# Altium footprint library 6.Transistors&Chips.PcbLib: 88 footprints (part 1 of 6)
Each footprint in its own frame and in the unit in brackets; x right, y up, seen from the top. Pads: shape width x height; smd on the part's side, far side on the other; paste and mask are expansions set on the pad; w line width, h text height; cw(c..) or ccw(c..) is an arc to the next point about the centre after c.
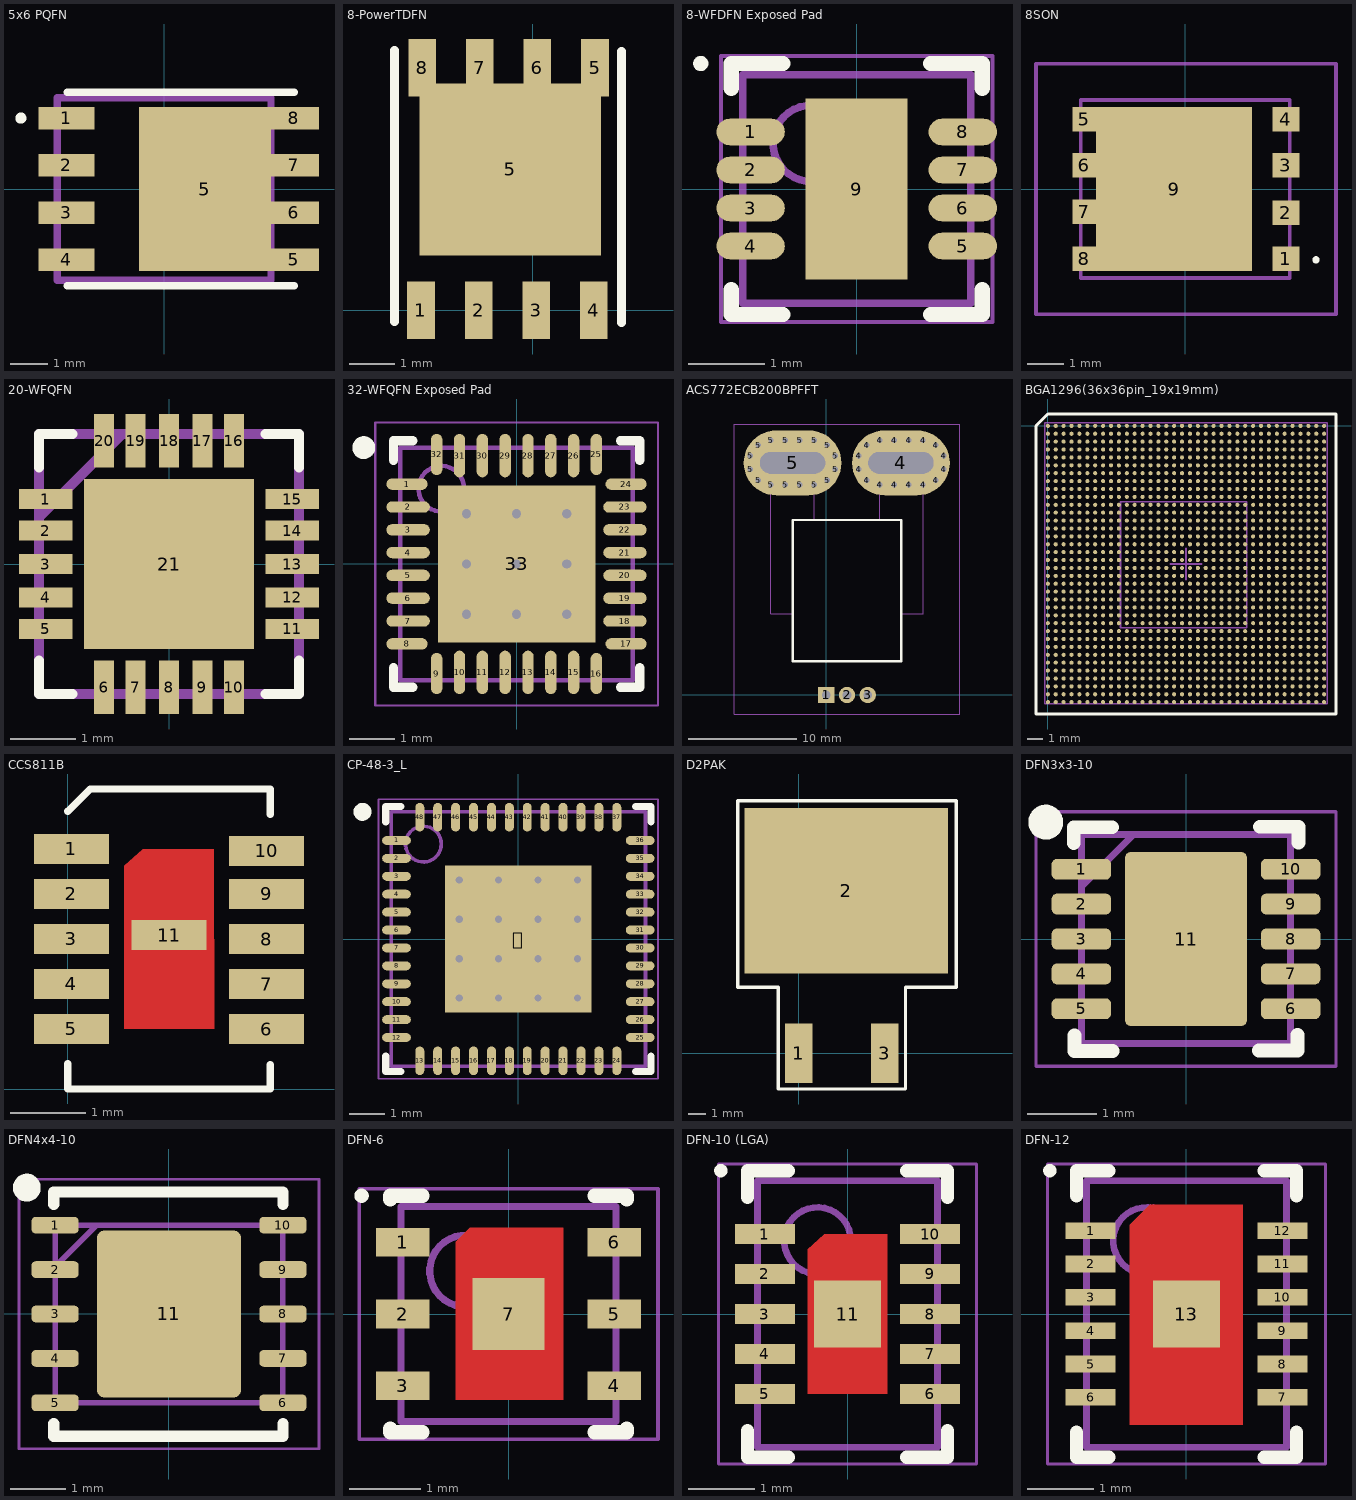
[diagram p0: the footprints below, top view; thin cyan lines are the x and y axes]

## 5x6 PQFN [mm] "IRFH8318"
pads (9):
  rect 1.5x0.6 smd: 1(-2.625,1.905) 2(-2.625,0.635) 3(-2.625,-0.635) 4(-2.625,-1.905)
  rect 3.545x4.41 smd: 5(1.1,0)
  rect 1.35x0.6 smd: 5(3.49,-1.905) 6(3.49,-0.635) 7(3.49,0.635) 8(3.49,1.905)
Top Overlay:
  lines w0.2: -2.6,-2.6 3.5,-2.6 ; -2.6,2.6 3.5,2.6 ; -3.9,1.905 cw(c-3.85,1.905) -3.8,1.905 ; -3.9,1.905 ccw(c-3.85,1.905) -3.8,1.905 ; -3.9,1.905 cw(c-3.85,1.905) -3.8,1.905
Mechanical 13:
  lines w0.2: -2.875,-2.45 2.875,-2.45 2.875,2.45 -2.875,2.45 -2.875,-2.45
3D body "User Library-PQFN8_5X6.STEP": height 1, standoff 0, extent -2.7,-2.55 3.5,2.55

## 8-PowerTDFN [mm]
pads (9):
  rect 0.61x1.27 smd: 1(-2.465,0) 2(-1.195,0) 3(0.075,0) 4(1.345,0) 5(1.37,5.34) 6(0.1,5.34) 7(-1.17,5.34) 8(-2.44,5.34)
  rect 4x3.8 smd: 5(-0.5,3.1)
Top Overlay:
  lines w0.2: -3.05,-0.25 -3.05,5.725 ; 1.95,-0.275 1.95,5.7
3D body "User Library-DQH0008A.STEP": height 1.05, standoff 0, extent -3.05,-0.275 1.95,5.725

## 8-WFDFN Exposed Pad [mm] "PSON, 8-Leads, Body 3.00x3.00mm, Pitch 0.50mm, Thermal Pad 2.38x1.34mm, IPC Medium Density"
height 0.75
pads (9):
  rrect100% 0.9x0.35 smd: 1(-1.395,0.75) 2(-1.395,0.25) 3(-1.395,-0.25) 4(-1.395,-0.75) 5(1.395,-0.75) 6(1.395,-0.25) 7(1.395,0.25) 8(1.395,0.75)
  rect 1.34x2.38 smd: 9(0,0)
Top Overlay:
  circle w0.1: c-2.05,1.65 r0.05
  lines w0.2: -1.65,-1.325 -1.65,-1.65 -0.97,-1.65 ; -1.65,1.325 -1.65,1.65 -0.97,1.65 ; 0.97,-1.65 1.65,-1.65 1.65,-1.325 ; 0.97,1.65 1.65,1.65 1.65,1.325
Mechanical 13:
  circle w0.1: c-0.6,0.6 r0.5
  lines w0.1: -1.5,-1.5 1.5,-1.5 1.5,1.5 -1.5,1.5 -1.5,-1.5
Mechanical 15:
  lines w0.05: -1.785,-1.75 1.785,-1.75 1.785,1.75 -1.785,1.75 -1.785,-1.75
  lines w0.1: -0.5,0 0.5,0 ; 0,-0.5 0,0.5
3D body "PSON50P300X75_HS-9N.step": height 0.75, standoff 0, extent -1.501,-1.5 1.501,1.5

## 8SON [mm]
pads (9):
  rect 0.75x0.675 smd: 1(2.776,-1.918) 2(2.776,-0.66) 3(2.776,0.66) 4(2.776,1.918)
  rect 0.655x0.675 smd: 5(-2.776,1.918) 6(-2.776,0.66) 7(-2.776,-0.622) 8(-2.776,-1.918)
  rect 4.295x4.51 smd: 9(-0.301,0)
Top Overlay:
  lines w0.1: 3.6,-2 cw(c3.6,-1.95) 3.6,-1.9 cw(c3.6,-1.95) 3.6,-2
Mechanical 13:
  lines w0.1: -2.875,-2.45 -2.875,2.45 2.875,2.45 2.875,-2.45 -2.875,-2.45
Mechanical 15:
  lines w0.1: -4.104,-3.45 -4.104,3.45 4.152,3.45 4.152,-3.45 -4.104,-3.45
3D body "CSD16403Q5A.stp": height 1.15, standoff 0, extent -3.13,-2.45 3.13,2.45

## 20-WFQFN [mil]
pads (21):
  rect 32x12 smd: 1(-74,39) 2(-74,20) 3(-74,0) 4(-74,-20) 5(-74,-39) 11(74,-39) 12(74,-20) 13(74,0) 14(74,20) 15(74,39)
  rect 12x32 smd: 6(-39,-74) 7(-20,-74) 8(0,-74) 9(20,-74) 10(39,-74) 16(39,74) 17(20,74) 18(0,74) 19(-20,74) 20(-39,74)
  rect 102x102 smd: 21(0,0)
Top Overlay:
  lines w6: -78,-58 -78,-78 -58,-78 ; -78,58 -78,78 -58,78 ; 58,-78 78,-78 78,-58 ; 58,78 78,78 78,58
Mechanical 13:
  lines w6: -78,-45 -78,-33 ; -78,-26 -78,-14 ; -78,-6 -78,6 ; -78,14 -78,26 ; -78,28 -28,78 ; -78,33 -78,45 ; -45,-78 -33,-78 ; -45,78 -33,78 ; -26,-78 -14,-78 ; -26,78 -14,78 ; -6,-78 6,-78 ; -6,78 6,78 ; 14,-78 26,-78 ; 14,78 26,78 ; 33,-78 45,-78 ; 33,78 45,78 ; 78,-45 78,-33 ; 78,-26 78,-14 ; 78,-6 78,6 ; 78,14 78,26 ; 78,33 78,45 ; -78,-78 78,-78 78,78 -78,78 -78,-78
3D body "LT3741IUFPBF.stp": height 29.53, standoff 0, extent -78.74,-78.74 78.74,78.74

## 32-WFQFN Exposed Pad [mm] "QFN, 32-Leads, Body 5.00x5.00mm, Pitch 0.50mm, Thermal Pad 3.45x3.45mm, IPC Medium Density"
height 0.8
pads (33):
  oval 0.9x0.25 smd: 1(-2.4,1.75) 8(-2.4,-1.75) 17(2.4,-1.75) 24(2.4,1.75)
  oval 0.95x0.25 smd: 2(-2.375,1.25) 3(-2.375,0.75) 4(-2.375,0.25) 5(-2.375,-0.25) 6(-2.375,-0.75) 7(-2.375,-1.25) 18(2.375,-1.25) 19(2.375,-0.75) 20(2.375,-0.25) 21(2.375,0.25) 22(2.375,0.75) 23(2.375,1.25)
  oval 0.25x0.9 smd: 9(-1.75,-2.4) 16(1.75,-2.4) 25(1.75,2.4) 32(-1.75,2.4)
  oval 0.25x0.95 smd: 10(-1.25,-2.375) 11(-0.75,-2.375) 12(-0.25,-2.375) 13(0.25,-2.375) 14(0.75,-2.375) 15(1.25,-2.375) 26(1.25,2.375) 27(0.75,2.375) 28(0.25,2.375) 29(-0.25,2.375) 30(-0.75,2.375) 31(-1.25,2.375)
  rect 3.45x3.45 smd: 33(0,0)
via -1.1,1.1 diameter 0.5 hole 0.2
via 0,1.1 diameter 0.5 hole 0.2
via 1.1,1.1 diameter 0.5 hole 0.2
via -1.1,0 diameter 0.5 hole 0.2
via 0,0 diameter 0.5 hole 0.2
via 1.1,0 diameter 0.5 hole 0.2
via -1.1,-1.1 diameter 0.5 hole 0.2
via 0,-1.1 diameter 0.5 hole 0.2
via 1.1,-1.1 diameter 0.5 hole 0.2
Top Overlay:
  circle w0.25: c-3.35,2.55 r0.125
  lines w0.2: -2.7,-2.275 -2.7,-2.7 -2.275,-2.7 ; -2.7,2.275 -2.7,2.7 -2.275,2.7 ; 2.275,-2.7 2.7,-2.7 2.7,-2.275 ; 2.275,2.7 2.7,2.7 2.7,2.275
Mechanical 13:
  circle w0.1: c-1.65,1.65 r0.5
  lines w0.1: -2.55,-2.55 -2.55,2.55 2.55,2.55 2.55,-2.55 -2.55,-2.55
Mechanical 15:
  lines w0.05: -3.1,-3.1 -3.1,3.1 3.1,3.1 3.1,-3.1 -3.1,-3.1
  lines w0.1: -0.5,0 0.5,0 ; 0,-0.5 0,0.5
3D body "QFN50P500X500X80_HS-33N.step": height 0.8, standoff 0, extent -2.6,-2.6 2.6,2.6

## ACS772ECB200BPFFT [mm]
pads (37):
  rect 1.5x1.5 hole 0.8: 1(0,0)
  round 1.5 hole 0.8: 2(1.91,0) 3(3.82,0)
  round 1 hole 0.5: 4(3.008,20.782) 4(3.008,22.018) 4(3.734,19.782) 4(3.734,23.018) 4(4.91,19.35) 4(4.91,23.45) 4(6.243,19.35) 4(6.243,23.45) 4(7.577,19.35) 4(7.577,23.45) 4(8.91,19.35) 4(8.91,23.45) 4(10.086,19.782) 4(10.086,23.018) 4(10.812,20.782) 4(10.812,22.018) 5(-6.992,20.782) 5(-6.992,22.018) 5(-6.266,19.782) 5(-6.266,23.018) 5(-5.09,19.35) 5(-5.09,23.45) 5(-3.757,19.35) 5(-3.757,23.45) 5(-2.423,19.35) 5(-2.423,23.45) 5(-1.09,19.35) 5(-1.09,23.45) 5(0.086,19.782) 5(0.086,23.018) 5(0.812,20.782) 5(0.812,22.018)
  rrect100% 9x6 hole 2 slot 6 at 0 deg: 4(6.875,21.375) 5(-3.1,21.375)
Top Overlay:
  lines w0.2: -5.39,21 -4.49,21 -4.49,21.4 -5.29,21.4 -5.29,21.8 -4.39,21.8 ; -4.09,21.9 -4.09,21 -3.29,21 ; -2.99,21.8 -2.09,21.8 -2.09,21 -2.89,21 -2.89,21.8 ; -1.69,21.8 -0.89,21.8 ; -1.29,20.9 -1.29,21.8 ; 4.61,21 5.51,21 5.51,21.4 4.71,21.4 4.71,21.8 5.61,21.8 ; 5.91,21.9 5.91,21 6.71,21 ; 7.11,21.8 7.91,21.8 7.91,21 7.11,21 7.11,21.9 ; 8.31,21.8 9.11,21.8 ; 8.71,20.9 8.71,21.9 ; -3.09,3.1 6.91,3.1 6.91,16.1 -3.09,16.1 -3.09,3.1
Mechanical 13:
  lines w0.1: -3.09,7.5 -5.09,7.5 -5.09,20.3 -1.09,20.3 -1.09,16.1 ; 4.91,16.1 4.91,20.3 8.91,20.3 8.91,7.5 6.91,7.5 ; -5.09,20.4 cw(c-5.09,21.4) -5.09,22.4 -1.09,22.4 cw(c-1.09,21.4) -1.09,20.4 -5.09,20.4 ; -3.09,3.1 6.91,3.1 6.91,16.1 -3.09,16.1 -3.09,3.1 ; 4.91,20.4 cw(c4.91,21.4) 4.91,22.4 8.91,22.4 cw(c8.91,21.4) 8.91,20.4 4.91,20.4
Mechanical 15:
  lines w0.1: -8.492,-1.75 12.312,-1.75 12.312,24.95 -8.492,24.95 -8.492,-1.75
3D body "ACS758LCB-050U-PFF-T.stp": height 6.97, standoff -3.57, extent -5.062,-0.484 8.938,22.333

## BGA1296(36x36pin_19x19mm) [mm]
height 2.5
pads (1296):
  round 0.26 smd mask+0.06: A1(0,0) A2(0.5,0) A3(1,0) A4(1.5,0) A5(2,0) A6(2.5,0) A7(3,0) A8(3.5,0) A9(4,0) A10(4.5,0) A11(5,0) A12(5.5,0) A13(6,0) A14(6.5,0) A15(7,0) A16(7.5,0) A17(8,0) A18(8.5,0) A19(9,0) A20(9.5,0) A21(10,0) A22(10.5,0) A23(11,0) A24(11.5,0) A25(12,0) A26(12.5,0) A27(13,0) A28(13.5,0) A29(14,0) A30(14.5,0) A31(15,0) A32(15.5,0) A33(16,0) A34(16.5,0) A35(17,0) A36(17.5,0) AA1(0,-10) AA2(0.5,-10) AA3(1,-10) AA4(1.5,-10) AA5(2,-10) AA6(2.5,-10) AA7(3,-10) AA8(3.5,-10) AA9(4,-10) AA10(4.5,-10) AA11(5,-10) AA12(5.5,-10) AA13(6,-10) AA14(6.5,-10) AA15(7,-10) AA16(7.5,-10) AA17(8,-10) AA18(8.5,-10) AA19(9,-10) AA20(9.5,-10) AA21(10,-10) AA22(10.5,-10) AA23(11,-10) AA24(11.5,-10) AA25(12,-10) AA26(12.5,-10) AA27(13,-10) AA28(13.5,-10) AA29(14,-10) AA30(14.5,-10) AA31(15,-10) AA32(15.5,-10) AA33(16,-10) AA34(16.5,-10) AA35(17,-10) AA36(17.5,-10) AB1(0,-10.5) AB2(0.5,-10.5) AB3(1,-10.5) AB4(1.5,-10.5) AB5(2,-10.5) AB6(2.5,-10.5) AB7(3,-10.5) AB8(3.5,-10.5) AB9(4,-10.5) AB10(4.5,-10.5) AB11(5,-10.5) AB12(5.5,-10.5) AB13(6,-10.5) AB14(6.5,-10.5) AB15(7,-10.5) AB16(7.5,-10.5) AB17(8,-10.5) AB18(8.5,-10.5) AB19(9,-10.5) AB20(9.5,-10.5) AB21(10,-10.5) AB22(10.5,-10.5) AB23(11,-10.5) AB24(11.5,-10.5) AB25(12,-10.5) AB26(12.5,-10.5) AB27(13,-10.5) AB28(13.5,-10.5) AB29(14,-10.5) AB30(14.5,-10.5) AB31(15,-10.5) AB32(15.5,-10.5) AB33(16,-10.5) AB34(16.5,-10.5) AB35(17,-10.5) AB36(17.5,-10.5) AC1(0,-11) AC2(0.5,-11) AC3(1,-11) AC4(1.5,-11) AC5(2,-11) AC6(2.5,-11) AC7(3,-11) AC8(3.5,-11) AC9(4,-11) AC10(4.5,-11) AC11(5,-11) AC12(5.5,-11) AC13(6,-11) AC14(6.5,-11) AC15(7,-11) AC16(7.5,-11) AC17(8,-11) AC18(8.5,-11) AC19(9,-11) AC20(9.5,-11) AC21(10,-11) AC22(10.5,-11) AC23(11,-11) AC24(11.5,-11) AC25(12,-11) AC26(12.5,-11) AC27(13,-11) AC28(13.5,-11) AC29(14,-11) AC30(14.5,-11) AC31(15,-11) AC32(15.5,-11) AC33(16,-11) AC34(16.5,-11) AC35(17,-11) AC36(17.5,-11) AD1(0,-11.5) AD2(0.5,-11.5) AD3(1,-11.5) AD4(1.5,-11.5) AD5(2,-11.5) AD6(2.5,-11.5) AD7(3,-11.5) AD8(3.5,-11.5) AD9(4,-11.5) AD10(4.5,-11.5) AD11(5,-11.5) AD12(5.5,-11.5) AD13(6,-11.5) AD14(6.5,-11.5) AD15(7,-11.5) AD16(7.5,-11.5) AD17(8,-11.5) AD18(8.5,-11.5) AD19(9,-11.5) AD20(9.5,-11.5) AD21(10,-11.5) AD22(10.5,-11.5) AD23(11,-11.5) AD24(11.5,-11.5) AD25(12,-11.5) AD26(12.5,-11.5) AD27(13,-11.5) AD28(13.5,-11.5) AD29(14,-11.5) AD30(14.5,-11.5) AD31(15,-11.5) AD32(15.5,-11.5) AD33(16,-11.5) AD34(16.5,-11.5) AD35(17,-11.5) AD36(17.5,-11.5) AE1(0,-12) AE2(0.5,-12) AE3(1,-12) AE4(1.5,-12) AE5(2,-12) AE6(2.5,-12) AE7(3,-12) AE8(3.5,-12) AE9(4,-12) AE10(4.5,-12) AE11(5,-12) AE12(5.5,-12) AE13(6,-12) AE14(6.5,-12) AE15(7,-12) AE16(7.5,-12) AE17(8,-12) AE18(8.5,-12) AE19(9,-12) AE20(9.5,-12) AE21(10,-12) AE22(10.5,-12) AE23(11,-12) AE24(11.5,-12) AE25(12,-12) AE26(12.5,-12) AE27(13,-12) AE28(13.5,-12) AE29(14,-12) AE30(14.5,-12) AE31(15,-12) AE32(15.5,-12) AE33(16,-12) AE34(16.5,-12) AE35(17,-12) AE36(17.5,-12) AF1(0,-12.5) AF2(0.5,-12.5) AF3(1,-12.5) AF4(1.5,-12.5) AF5(2,-12.5) AF6(2.5,-12.5) AF7(3,-12.5) AF8(3.5,-12.5) AF9(4,-12.5) AF10(4.5,-12.5) AF11(5,-12.5) AF12(5.5,-12.5) AF13(6,-12.5) AF14(6.5,-12.5) AF15(7,-12.5) AF16(7.5,-12.5) AF17(8,-12.5) AF18(8.5,-12.5) AF19(9,-12.5) AF20(9.5,-12.5) AF21(10,-12.5) AF22(10.5,-12.5) AF23(11,-12.5) AF24(11.5,-12.5) AF25(12,-12.5) AF26(12.5,-12.5) AF27(13,-12.5) AF28(13.5,-12.5) AF29(14,-12.5) AF30(14.5,-12.5) AF31(15,-12.5) AF32(15.5,-12.5) AF33(16,-12.5) AF34(16.5,-12.5) AF35(17,-12.5) AF36(17.5,-12.5) AG1(0,-13) AG2(0.5,-13) AG3(1,-13) AG4(1.5,-13) AG5(2,-13) AG6(2.5,-13) AG7(3,-13) AG8(3.5,-13) AG9(4,-13) AG10(4.5,-13) AG11(5,-13) AG12(5.5,-13) AG13(6,-13) AG14(6.5,-13) AG15(7,-13) AG16(7.5,-13) AG17(8,-13) AG18(8.5,-13) AG19(9,-13) AG20(9.5,-13) AG21(10,-13) AG22(10.5,-13) AG23(11,-13) AG24(11.5,-13) AG25(12,-13) AG26(12.5,-13) AG27(13,-13) AG28(13.5,-13) AG29(14,-13) AG30(14.5,-13) AG31(15,-13) AG32(15.5,-13) AG33(16,-13) AG34(16.5,-13) AG35(17,-13) AG36(17.5,-13) AH1(0,-13.5) AH2(0.5,-13.5) AH3(1,-13.5) AH4(1.5,-13.5) AH5(2,-13.5) AH6(2.5,-13.5) AH7(3,-13.5) AH8(3.5,-13.5) AH9(4,-13.5) AH10(4.5,-13.5) AH11(5,-13.5) AH12(5.5,-13.5) AH13(6,-13.5) AH14(6.5,-13.5) AH15(7,-13.5) AH16(7.5,-13.5) AH17(8,-13.5) AH18(8.5,-13.5) AH19(9,-13.5) AH20(9.5,-13.5) AH21(10,-13.5) AH22(10.5,-13.5) AH23(11,-13.5) AH24(11.5,-13.5) AH25(12,-13.5) AH26(12.5,-13.5) AH27(13,-13.5) AH28(13.5,-13.5) AH29(14,-13.5) AH30(14.5,-13.5) AH31(15,-13.5) AH32(15.5,-13.5) AH33(16,-13.5) AH34(16.5,-13.5) AH35(17,-13.5) AH36(17.5,-13.5) AJ1(0,-14) AJ2(0.5,-14) AJ3(1,-14) AJ4(1.5,-14) AJ5(2,-14) AJ6(2.5,-14) AJ7(3,-14) AJ8(3.5,-14) AJ9(4,-14) AJ10(4.5,-14) AJ11(5,-14) AJ12(5.5,-14) AJ13(6,-14) AJ14(6.5,-14) AJ15(7,-14) AJ16(7.5,-14) AJ17(8,-14) AJ18(8.5,-14) AJ19(9,-14) AJ20(9.5,-14) AJ21(10,-14) AJ22(10.5,-14) AJ23(11,-14) AJ24(11.5,-14) AJ25(12,-14) AJ26(12.5,-14) AJ27(13,-14) AJ28(13.5,-14) AJ29(14,-14) AJ30(14.5,-14) AJ31(15,-14) AJ32(15.5,-14) AJ33(16,-14) AJ34(16.5,-14) AJ35(17,-14) AJ36(17.5,-14) AK1(0,-14.5) AK2(0.5,-14.5) AK3(1,-14.5) AK4(1.5,-14.5) AK5(2,-14.5) AK6(2.5,-14.5) AK7(3,-14.5) AK8(3.5,-14.5) AK9(4,-14.5) AK10(4.5,-14.5) AK11(5,-14.5) AK12(5.5,-14.5) AK13(6,-14.5) AK14(6.5,-14.5) AK15(7,-14.5) AK16(7.5,-14.5) AK17(8,-14.5) AK18(8.5,-14.5) AK19(9,-14.5) AK20(9.5,-14.5) AK21(10,-14.5) AK22(10.5,-14.5) AK23(11,-14.5) AK24(11.5,-14.5) AK25(12,-14.5) AK26(12.5,-14.5) AK27(13,-14.5) AK28(13.5,-14.5) AK29(14,-14.5) AK30(14.5,-14.5) AK31(15,-14.5) AK32(15.5,-14.5) AK33(16,-14.5) AK34(16.5,-14.5) AK35(17,-14.5) AK36(17.5,-14.5) AL1(0,-15) AL2(0.5,-15) AL3(1,-15) AL4(1.5,-15) AL5(2,-15) AL6(2.5,-15) AL7(3,-15) AL8(3.5,-15) AL9(4,-15) AL10(4.5,-15) AL11(5,-15) AL12(5.5,-15) AL13(6,-15) AL14(6.5,-15) AL15(7,-15) AL16(7.5,-15) AL17(8,-15) AL18(8.5,-15) AL19(9,-15) AL20(9.5,-15) AL21(10,-15) AL22(10.5,-15) AL23(11,-15) AL24(11.5,-15) AL25(12,-15) AL26(12.5,-15) AL27(13,-15) AL28(13.5,-15) AL29(14,-15) AL30(14.5,-15) AL31(15,-15) AL32(15.5,-15) AL33(16,-15) AL34(16.5,-15) AL35(17,-15) AL36(17.5,-15) AM1(0,-15.5) AM2(0.5,-15.5) AM3(1,-15.5) AM4(1.5,-15.5) AM5(2,-15.5) AM6(2.5,-15.5) AM7(3,-15.5) AM8(3.5,-15.5) AM9(4,-15.5) AM10(4.5,-15.5) AM11(5,-15.5) AM12(5.5,-15.5) AM13(6,-15.5) AM14(6.5,-15.5) AM15(7,-15.5) AM16(7.5,-15.5) AM17(8,-15.5) AM18(8.5,-15.5) AM19(9,-15.5) AM20(9.5,-15.5) AM21(10,-15.5) AM22(10.5,-15.5) AM23(11,-15.5) AM24(11.5,-15.5) AM25(12,-15.5) AM26(12.5,-15.5) AM27(13,-15.5) AM28(13.5,-15.5) AM29(14,-15.5) AM30(14.5,-15.5) AM31(15,-15.5) AM32(15.5,-15.5) AM33(16,-15.5) AM34(16.5,-15.5) AM35(17,-15.5) AM36(17.5,-15.5) AN1(0,-16) AN2(0.5,-16) AN3(1,-16) AN4(1.5,-16) AN5(2,-16) AN6(2.5,-16) AN7(3,-16) AN8(3.5,-16) AN9(4,-16) AN10(4.5,-16) AN11(5,-16) AN12(5.5,-16) AN13(6,-16) AN14(6.5,-16) AN15(7,-16) AN16(7.5,-16) AN17(8,-16) AN18(8.5,-16) AN19(9,-16) AN20(9.5,-16) AN21(10,-16) AN22(10.5,-16) AN23(11,-16) AN24(11.5,-16) AN25(12,-16) AN26(12.5,-16) AN27(13,-16) AN28(13.5,-16) AN29(14,-16) AN30(14.5,-16) AN31(15,-16) AN32(15.5,-16) AN33(16,-16) AN34(16.5,-16) AN35(17,-16) AN36(17.5,-16) AP1(0,-16.5) AP2(0.5,-16.5) AP3(1,-16.5) AP4(1.5,-16.5) AP5(2,-16.5) AP6(2.5,-16.5) AP7(3,-16.5) AP8(3.5,-16.5) AP9(4,-16.5) AP10(4.5,-16.5) AP11(5,-16.5) AP12(5.5,-16.5) AP13(6,-16.5) AP14(6.5,-16.5) AP15(7,-16.5) AP16(7.5,-16.5) AP17(8,-16.5) AP18(8.5,-16.5) AP19(9,-16.5) AP20(9.5,-16.5) AP21(10,-16.5) AP22(10.5,-16.5) AP23(11,-16.5) AP24(11.5,-16.5) AP25(12,-16.5) AP26(12.5,-16.5) AP27(13,-16.5) AP28(13.5,-16.5) AP29(14,-16.5) AP30(14.5,-16.5) AP31(15,-16.5) AP32(15.5,-16.5) AP33(16,-16.5) AP34(16.5,-16.5) AP35(17,-16.5) AP36(17.5,-16.5) AR1(0,-17) AR2(0.5,-17) AR3(1,-17) AR4(1.5,-17) AR5(2,-17) AR6(2.5,-17) AR7(3,-17) AR8(3.5,-17) AR9(4,-17) AR10(4.5,-17) AR11(5,-17) AR12(5.5,-17) AR13(6,-17) AR14(6.5,-17) AR15(7,-17) AR16(7.5,-17) AR17(8,-17) AR18(8.5,-17) AR19(9,-17) AR20(9.5,-17) AR21(10,-17) AR22(10.5,-17) AR23(11,-17) AR24(11.5,-17) AR25(12,-17) AR26(12.5,-17) AR27(13,-17) AR28(13.5,-17) AR29(14,-17) AR30(14.5,-17) AR31(15,-17) AR32(15.5,-17) AR33(16,-17) AR34(16.5,-17) AR35(17,-17) AR36(17.5,-17) AT1(0,-17.5) AT2(0.5,-17.5) AT3(1,-17.5) AT4(1.5,-17.5) AT5(2,-17.5) AT6(2.5,-17.5) AT7(3,-17.5) AT8(3.5,-17.5) AT9(4,-17.5) AT10(4.5,-17.5) AT11(5,-17.5) AT12(5.5,-17.5) AT13(6,-17.5) AT14(6.5,-17.5) AT15(7,-17.5) AT16(7.5,-17.5) AT17(8,-17.5) AT18(8.5,-17.5) AT19(9,-17.5) AT20(9.5,-17.5) AT21(10,-17.5) AT22(10.5,-17.5) AT23(11,-17.5) AT24(11.5,-17.5) AT25(12,-17.5) AT26(12.5,-17.5) AT27(13,-17.5) AT28(13.5,-17.5) AT29(14,-17.5) AT30(14.5,-17.5) AT31(15,-17.5) AT32(15.5,-17.5) AT33(16,-17.5) AT34(16.5,-17.5) AT35(17,-17.5) AT36(17.5,-17.5) B1(0,-0.5) B2(0.5,-0.5) B3(1,-0.5) B4(1.5,-0.5) B5(2,-0.5) B6(2.5,-0.5) B7(3,-0.5) B8(3.5,-0.5) B9(4,-0.5) B10(4.5,-0.5) B11(5,-0.5) B12(5.5,-0.5) B13(6,-0.5) B14(6.5,-0.5) B15(7,-0.5) B16(7.5,-0.5) B17(8,-0.5) B18(8.5,-0.5) B19(9,-0.5) B20(9.5,-0.5) B21(10,-0.5) B22(10.5,-0.5) B23(11,-0.5) B24(11.5,-0.5) B25(12,-0.5) B26(12.5,-0.5) B27(13,-0.5) B28(13.5,-0.5) B29(14,-0.5) B30(14.5,-0.5) B31(15,-0.5) B32(15.5,-0.5) B33(16,-0.5) B34(16.5,-0.5) B35(17,-0.5) B36(17.5,-0.5) C1(0,-1) C2(0.5,-1) C3(1,-1) C4(1.5,-1) C5(2,-1) C6(2.5,-1) C7(3,-1) C8(3.5,-1) C9(4,-1) C10(4.5,-1) C11(5,-1) C12(5.5,-1) C13(6,-1) C14(6.5,-1) C15(7,-1) C16(7.5,-1) C17(8,-1) C18(8.5,-1) C19(9,-1) C20(9.5,-1) C21(10,-1) C22(10.5,-1) C23(11,-1) C24(11.5,-1) C25(12,-1) C26(12.5,-1) C27(13,-1) C28(13.5,-1) C29(14,-1) C30(14.5,-1) C31(15,-1) C32(15.5,-1) C33(16,-1) C34(16.5,-1) C35(17,-1) C36(17.5,-1) D1(0,-1.5) D2(0.5,-1.5) D3(1,-1.5) D4(1.5,-1.5) D5(2,-1.5) D6(2.5,-1.5) D7(3,-1.5) D8(3.5,-1.5) D9(4,-1.5) D10(4.5,-1.5) D11(5,-1.5) D12(5.5,-1.5) D13(6,-1.5) D14(6.5,-1.5) D15(7,-1.5) D16(7.5,-1.5) D17(8,-1.5) D18(8.5,-1.5) D19(9,-1.5) D20(9.5,-1.5) D21(10,-1.5) D22(10.5,-1.5) D23(11,-1.5) D24(11.5,-1.5) D25(12,-1.5) D26(12.5,-1.5) D27(13,-1.5) D28(13.5,-1.5) D29(14,-1.5) D30(14.5,-1.5) D31(15,-1.5) D32(15.5,-1.5) D33(16,-1.5) D34(16.5,-1.5) D35(17,-1.5) D36(17.5,-1.5) E1(0,-2) E2(0.5,-2) E3(1,-2) E4(1.5,-2) E5(2,-2) E6(2.5,-2) E7(3,-2) E8(3.5,-2) E9(4,-2) E10(4.5,-2) E11(5,-2) E12(5.5,-2) E13(6,-2) E14(6.5,-2) E15(7,-2) E16(7.5,-2) E17(8,-2) E18(8.5,-2) E19(9,-2) E20(9.5,-2) E21(10,-2) E22(10.5,-2) E23(11,-2) E24(11.5,-2) E25(12,-2) E26(12.5,-2) E27(13,-2) E28(13.5,-2) E29(14,-2) E30(14.5,-2) E31(15,-2) E32(15.5,-2) E33(16,-2) E34(16.5,-2) E35(17,-2) E36(17.5,-2) F1(0,-2.5) F2(0.5,-2.5) F3(1,-2.5) F4(1.5,-2.5) F5(2,-2.5) F6(2.5,-2.5) F7(3,-2.5) F8(3.5,-2.5) F9(4,-2.5) F10(4.5,-2.5) F11(5,-2.5) F12(5.5,-2.5) F13(6,-2.5) F14(6.5,-2.5) F15(7,-2.5) F16(7.5,-2.5) F17(8,-2.5) F18(8.5,-2.5) F19(9,-2.5) F20(9.5,-2.5) F21(10,-2.5) F22(10.5,-2.5) F23(11,-2.5) F24(11.5,-2.5) F25(12,-2.5) F26(12.5,-2.5) F27(13,-2.5) F28(13.5,-2.5) F29(14,-2.5) F30(14.5,-2.5) F31(15,-2.5) F32(15.5,-2.5) F33(16,-2.5) F34(16.5,-2.5) F35(17,-2.5) F36(17.5,-2.5) G1(0,-3) G2(0.5,-3) G3(1,-3) G4(1.5,-3) G5(2,-3) G6(2.5,-3) G7(3,-3) G8(3.5,-3) G9(4,-3) G10(4.5,-3) G11(5,-3) G12(5.5,-3) G13(6,-3) G14(6.5,-3) G15(7,-3) G16(7.5,-3) G17(8,-3) G18(8.5,-3) G19(9,-3) G20(9.5,-3) G21(10,-3) G22(10.5,-3) G23(11,-3) G24(11.5,-3) G25(12,-3) G26(12.5,-3) G27(13,-3) G28(13.5,-3) G29(14,-3) G30(14.5,-3) G31(15,-3) G32(15.5,-3) G33(16,-3) G34(16.5,-3) G35(17,-3) G36(17.5,-3) H1(0,-3.5) H2(0.5,-3.5) H3(1,-3.5) H4(1.5,-3.5) H5(2,-3.5) H6(2.5,-3.5) H7(3,-3.5) H8(3.5,-3.5) H9(4,-3.5) H10(4.5,-3.5) H11(5,-3.5) H12(5.5,-3.5) H13(6,-3.5) H14(6.5,-3.5) H15(7,-3.5) H16(7.5,-3.5) H17(8,-3.5) H18(8.5,-3.5) H19(9,-3.5) H20(9.5,-3.5) H21(10,-3.5) H22(10.5,-3.5) H23(11,-3.5) H24(11.5,-3.5) H25(12,-3.5) H26(12.5,-3.5) H27(13,-3.5) H28(13.5,-3.5) H29(14,-3.5) H30(14.5,-3.5) H31(15,-3.5) H32(15.5,-3.5) H33(16,-3.5) H34(16.5,-3.5) H35(17,-3.5) H36(17.5,-3.5) J1(0,-4) J2(0.5,-4) J3(1,-4) J4(1.5,-4) J5(2,-4) J6(2.5,-4) J7(3,-4) J8(3.5,-4) J9(4,-4) J10(4.5,-4) J11(5,-4) J12(5.5,-4) J13(6,-4) J14(6.5,-4) J15(7,-4) J16(7.5,-4) J17(8,-4) J18(8.5,-4) J19(9,-4) J20(9.5,-4) J21(10,-4) J22(10.5,-4) J23(11,-4) J24(11.5,-4) J25(12,-4) J26(12.5,-4) J27(13,-4) J28(13.5,-4) J29(14,-4) J30(14.5,-4) J31(15,-4) J32(15.5,-4) J33(16,-4) J34(16.5,-4) J35(17,-4) J36(17.5,-4) K1(0,-4.5) K2(0.5,-4.5) K3(1,-4.5) K4(1.5,-4.5) K5(2,-4.5) K6(2.5,-4.5) K7(3,-4.5) K8(3.5,-4.5) K9(4,-4.5) K10(4.5,-4.5) K11(5,-4.5) K12(5.5,-4.5) K13(6,-4.5) K14(6.5,-4.5) K15(7,-4.5) K16(7.5,-4.5) K17(8,-4.5) K18(8.5,-4.5) K19(9,-4.5) K20(9.5,-4.5) K21(10,-4.5) K22(10.5,-4.5) K23(11,-4.5) K24(11.5,-4.5) K25(12,-4.5) K26(12.5,-4.5) K27(13,-4.5) K28(13.5,-4.5) K29(14,-4.5) K30(14.5,-4.5) K31(15,-4.5) K32(15.5,-4.5) K33(16,-4.5) K34(16.5,-4.5) K35(17,-4.5) K36(17.5,-4.5) L1(0,-5) L2(0.5,-5) L3(1,-5) L4(1.5,-5) L5(2,-5) L6(2.5,-5) L7(3,-5) L8(3.5,-5) L9(4,-5) L10(4.5,-5) L11(5,-5) L12(5.5,-5) L13(6,-5) L14(6.5,-5) L15(7,-5) L16(7.5,-5) L17(8,-5) L18(8.5,-5) L19(9,-5) L20(9.5,-5) L21(10,-5) L22(10.5,-5) L23(11,-5) L24(11.5,-5) L25(12,-5) L26(12.5,-5) L27(13,-5) L28(13.5,-5) L29(14,-5) L30(14.5,-5) L31(15,-5) L32(15.5,-5) L33(16,-5) L34(16.5,-5) L35(17,-5) L36(17.5,-5) M1(0,-5.5) M2(0.5,-5.5) M3(1,-5.5) M4(1.5,-5.5) M5(2,-5.5) M6(2.5,-5.5) M7(3,-5.5) M8(3.5,-5.5) M9(4,-5.5) M10(4.5,-5.5) M11(5,-5.5) M12(5.5,-5.5) M13(6,-5.5) M14(6.5,-5.5) M15(7,-5.5) M16(7.5,-5.5) M17(8,-5.5) M18(8.5,-5.5) M19(9,-5.5) M20(9.5,-5.5) M21(10,-5.5) M22(10.5,-5.5) M23(11,-5.5) M24(11.5,-5.5) M25(12,-5.5) M26(12.5,-5.5) M27(13,-5.5) M28(13.5,-5.5) M29(14,-5.5) M30(14.5,-5.5) M31(15,-5.5) M32(15.5,-5.5) M33(16,-5.5) M34(16.5,-5.5) M35(17,-5.5) M36(17.5,-5.5) N1(0,-6) N2(0.5,-6) N3(1,-6) N4(1.5,-6) N5(2,-6) N6(2.5,-6) N7(3,-6) N8(3.5,-6) N9(4,-6) N10(4.5,-6) N11(5,-6) N12(5.5,-6) N13(6,-6) N14(6.5,-6) N15(7,-6) N16(7.5,-6) N17(8,-6) N18(8.5,-6) N19(9,-6) N20(9.5,-6) N21(10,-6) N22(10.5,-6) N23(11,-6) N24(11.5,-6) N25(12,-6) N26(12.5,-6) N27(13,-6) N28(13.5,-6) N29(14,-6) N30(14.5,-6) N31(15,-6) N32(15.5,-6) N33(16,-6) N34(16.5,-6) N35(17,-6) N36(17.5,-6) P1(0,-6.5) P2(0.5,-6.5) P3(1,-6.5) P4(1.5,-6.5) P5(2,-6.5) P6(2.5,-6.5) P7(3,-6.5) P8(3.5,-6.5) P9(4,-6.5) P10(4.5,-6.5) P11(5,-6.5) P12(5.5,-6.5) P13(6,-6.5) P14(6.5,-6.5) P15(7,-6.5) P16(7.5,-6.5) P17(8,-6.5) P18(8.5,-6.5) P19(9,-6.5) P20(9.5,-6.5) P21(10,-6.5) P22(10.5,-6.5) P23(11,-6.5) P24(11.5,-6.5) P25(12,-6.5) P26(12.5,-6.5) P27(13,-6.5) P28(13.5,-6.5) P29(14,-6.5) P30(14.5,-6.5) P31(15,-6.5) P32(15.5,-6.5) P33(16,-6.5) P34(16.5,-6.5) P35(17,-6.5) P36(17.5,-6.5) R1(0,-7) R2(0.5,-7) R3(1,-7) R4(1.5,-7) R5(2,-7) R6(2.5,-7) R7(3,-7) R8(3.5,-7) R9(4,-7) R10(4.5,-7) R11(5,-7) R12(5.5,-7) R13(6,-7) R14(6.5,-7) R15(7,-7) R16(7.5,-7) R17(8,-7) R18(8.5,-7) R19(9,-7) R20(9.5,-7) R21(10,-7) R22(10.5,-7) R23(11,-7) R24(11.5,-7) R25(12,-7) R26(12.5,-7) R27(13,-7) R28(13.5,-7) R29(14,-7) R30(14.5,-7) R31(15,-7) R32(15.5,-7) R33(16,-7) R34(16.5,-7) R35(17,-7) R36(17.5,-7) T1(0,-7.5) T2(0.5,-7.5) T3(1,-7.5) T4(1.5,-7.5) T5(2,-7.5) T6(2.5,-7.5) T7(3,-7.5) T8(3.5,-7.5) T9(4,-7.5) T10(4.5,-7.5) T11(5,-7.5) T12(5.5,-7.5) T13(6,-7.5) T14(6.5,-7.5) T15(7,-7.5) T16(7.5,-7.5) T17(8,-7.5) T18(8.5,-7.5) T19(9,-7.5) T20(9.5,-7.5) T21(10,-7.5) T22(10.5,-7.5) T23(11,-7.5) T24(11.5,-7.5) T25(12,-7.5) T26(12.5,-7.5) T27(13,-7.5) T28(13.5,-7.5) T29(14,-7.5) T30(14.5,-7.5) T31(15,-7.5) T32(15.5,-7.5) T33(16,-7.5) T34(16.5,-7.5) T35(17,-7.5) T36(17.5,-7.5) U1(0,-8) U2(0.5,-8) U3(1,-8) U4(1.5,-8) U5(2,-8) U6(2.5,-8) U7(3,-8) U8(3.5,-8) U9(4,-8) U10(4.5,-8) U11(5,-8) U12(5.5,-8) U13(6,-8) U14(6.5,-8) U15(7,-8) U16(7.5,-8) U17(8,-8) U18(8.5,-8) U19(9,-8) U20(9.5,-8) U21(10,-8) U22(10.5,-8) U23(11,-8) U24(11.5,-8) U25(12,-8) U26(12.5,-8) U27(13,-8) U28(13.5,-8) U29(14,-8) U30(14.5,-8) U31(15,-8) U32(15.5,-8) U33(16,-8) U34(16.5,-8) U35(17,-8) U36(17.5,-8) V1(0,-8.5) V2(0.5,-8.5) V3(1,-8.5) V4(1.5,-8.5) V5(2,-8.5) V6(2.5,-8.5) V7(3,-8.5) V8(3.5,-8.5) V9(4,-8.5) V10(4.5,-8.5) V11(5,-8.5) V12(5.5,-8.5) V13(6,-8.5) V14(6.5,-8.5) V15(7,-8.5) V16(7.5,-8.5) V17(8,-8.5) V18(8.5,-8.5) V19(9,-8.5) V20(9.5,-8.5) V21(10,-8.5) V22(10.5,-8.5) V23(11,-8.5) V24(11.5,-8.5) V25(12,-8.5) V26(12.5,-8.5) V27(13,-8.5) V28(13.5,-8.5) V29(14,-8.5) V30(14.5,-8.5) V31(15,-8.5) V32(15.5,-8.5) V33(16,-8.5) V34(16.5,-8.5) V35(17,-8.5) V36(17.5,-8.5) W1(0,-9) W2(0.5,-9) W3(1,-9) W4(1.5,-9) W5(2,-9) W6(2.5,-9) W7(3,-9) W8(3.5,-9) W9(4,-9) W10(4.5,-9) W11(5,-9) W12(5.5,-9) W13(6,-9) W14(6.5,-9) W15(7,-9) W16(7.5,-9) W17(8,-9) W18(8.5,-9) W19(9,-9) W20(9.5,-9) W21(10,-9) W22(10.5,-9) W23(11,-9) W24(11.5,-9) W25(12,-9) W26(12.5,-9) W27(13,-9) W28(13.5,-9) W29(14,-9) W30(14.5,-9) W31(15,-9) W32(15.5,-9) W33(16,-9) W34(16.5,-9) W35(17,-9) W36(17.5,-9) Y1(0,-9.5) Y2(0.5,-9.5) Y3(1,-9.5) Y4(1.5,-9.5) Y5(2,-9.5) Y6(2.5,-9.5) Y7(3,-9.5) Y8(3.5,-9.5) Y9(4,-9.5) Y10(4.5,-9.5) Y11(5,-9.5) Y12(5.5,-9.5) Y13(6,-9.5) Y14(6.5,-9.5) Y15(7,-9.5) Y16(7.5,-9.5) Y17(8,-9.5) Y18(8.5,-9.5) Y19(9,-9.5) Y20(9.5,-9.5) Y21(10,-9.5) Y22(10.5,-9.5) Y23(11,-9.5) Y24(11.5,-9.5) Y25(12,-9.5) Y26(12.5,-9.5) Y27(13,-9.5) Y28(13.5,-9.5) Y29(14,-9.5) Y30(14.5,-9.5) Y31(15,-9.5) Y32(15.5,-9.5) Y33(16,-9.5) Y34(16.5,-9.5) Y35(17,-9.5) Y36(17.5,-9.5)
Top Overlay:
  lines w0.2: -0.75,-18.25 18.25,-18.25 18.25,0.75 0,0.75 -0.75,0 -0.75,-18.25
Mechanical 13:
  lines w0.1: 4.6,-12.8 12.6,-12.8 12.6,-4.8 4.6,-4.8 4.6,-12.8
Mechanical 15:
  lines w0.1: 7.75,-8.75 9.75,-8.75 ; 8.75,-9.75 8.75,-7.75 ; -0.2,-17.6 17.7,-17.6 17.7,0.2 -0.2,0.2 -0.2,-17.6
3D body: height 1.15, standoff 0, extent -0.751,-18.251 18.251,0.751
3D body: height 1.65, standoff 1.15, extent -0.199,-17.599 17.699,0.199
3D body: height 2.5, standoff 1.65, extent 3.6,-13.8 13.6,-3.8

## CCS811B [mm]
pads (11):
  rect 1x0.4 smd: 1(0.05,3.2) 2(0.05,2.6) 3(0.05,2) 4(0.05,1.4) 5(0.05,0.8) 6(2.65,0.8) 7(2.65,1.4) 8(2.65,2) 9(2.65,2.6) 10(2.65,3.175) 11(1.35,2.05)
Top Layer:
  region: 0.75,0.8 1.95,0.8 1.95,3.2 1,3.2 0.75,2.975
Top Overlay:
  lines w0.1: -0.001,0.01 -0.001,0.335 ; 0,0 2.7,0 2.7,0.325 ; 0,3.7 0.3,4 2.7,4 ; 2.699,3.66 2.699,3.985
3D body: height 1.1, standoff 0, extent 0,0.025 2.7,4.025

## CP-48-3_L [mm] "QFN, 48-Leads, Body 7x7mm, Pitch 0.5mm, Thermal Pad 4.1x4.1mm, IPC High Density"
height 1
pads (49):
  oval 0.8x0.25 smd: 1(-3.4,2.75) 2(-3.4,2.25) 3(-3.4,1.75) 4(-3.4,1.25) 5(-3.4,0.75) 6(-3.4,0.25) 7(-3.4,-0.25) 8(-3.4,-0.75) 9(-3.4,-1.25) 10(-3.4,-1.75) 11(-3.4,-2.25) 12(-3.4,-2.75) 25(3.4,-2.75) 26(3.4,-2.25) 27(3.4,-1.75) 28(3.4,-1.25) 29(3.4,-0.75) 30(3.4,-0.25) 31(3.4,0.25) 32(3.4,0.75) 33(3.4,1.25) 34(3.4,1.75) 35(3.4,2.25) 36(3.4,2.75)
  oval 0.25x0.8 smd: 13(-2.75,-3.4) 14(-2.25,-3.4) 15(-1.75,-3.4) 16(-1.25,-3.4) 17(-0.75,-3.4) 18(-0.25,-3.4) 19(0.25,-3.4) 20(0.75,-3.4) 21(1.25,-3.4) 22(1.75,-3.4) 23(2.25,-3.4) 24(2.75,-3.4) 37(2.75,3.4) 38(2.25,3.4) 39(1.75,3.4) 40(1.25,3.4) 41(0.75,3.4) 42(0.25,3.4) 43(-0.25,3.4) 44(-0.75,3.4) 45(-1.25,3.4) 46(-1.75,3.4) 47(-2.25,3.4) 48(-2.75,3.4)
  rect 4.1x4.1 smd paste+0 mask+0: (0,0)
via 1.65,-1.65 diameter 0.5 hole 0.2
via 0.55,-1.65 diameter 0.5 hole 0.2
via -0.55,-1.65 diameter 0.5 hole 0.2
via -1.65,-1.65 diameter 0.5 hole 0.2
via 1.65,-0.55 diameter 0.5 hole 0.2
via 0.55,-0.55 diameter 0.5 hole 0.2
via -0.55,-0.55 diameter 0.5 hole 0.2
via -1.65,-0.55 diameter 0.5 hole 0.2
via 1.65,0.55 diameter 0.5 hole 0.2
via 0.55,0.55 diameter 0.5 hole 0.2
via -0.55,0.55 diameter 0.5 hole 0.2
via -1.65,0.55 diameter 0.5 hole 0.2
via 1.65,1.65 diameter 0.5 hole 0.2
via 0.55,1.65 diameter 0.5 hole 0.2
via -0.55,1.65 diameter 0.5 hole 0.2
via -1.65,1.65 diameter 0.5 hole 0.2
Top Overlay:
  circle w0.25: c-4.35,3.55 r0.125
  lines w0.2: -3.7,-3.275 -3.7,-3.7 -3.275,-3.7 ; -3.7,3.275 -3.7,3.7 -3.275,3.7 ; 3.275,-3.7 3.7,-3.7 3.7,-3.275 ; 3.275,3.7 3.7,3.7 3.7,3.275
Top Solder:
  rectangle: 1.181,1.127 2.059,2.05
  rectangle: 0.056,1.128 1.076,2.05
  rectangle: -1.069,1.128 -0.049,2.05
  rectangle: -2.048,1.128 -1.17,2.05
  rectangle: 0.055,0.037 1.075,1.033
  rectangle: 1.18,0.036 2.058,1.032
  rectangle: -1.07,0.037 -0.05,1.033
  rectangle: -2.049,0.037 -1.171,1.033
  rectangle: 0.055,-1.045 1.075,-0.049
  rectangle: 1.18,-1.047 2.058,-0.051
  rectangle: -1.07,-1.045 -0.05,-0.049
  rectangle: -2.05,-1.045 -1.171,-0.049
  rectangle: 1.179,-2.051 2.058,-1.148
  rectangle: 0.054,-2.05 1.075,-1.147
  rectangle: -1.071,-2.05 -0.05,-1.147
  rectangle: -2.05,-2.05 -1.172,-1.147
Mechanical 13:
  circle w0.1: c-2.65,2.65 r0.5
  lines w0.1: -3.55,-3.55 3.55,-3.55 3.55,3.55 -3.55,3.55 -3.55,-3.55
Mechanical 15:
  lines w0.05: -3.9,-3.9 3.9,-3.9 3.9,3.9 -3.9,3.9 -3.9,-3.9
  lines w0.1: -0.5,0 0.5,0 ; 0,-0.5 0,0.5
3D body: height 1, standoff 0, extent -3.55,-3.55 3.55,3.55

## D2PAK [mm]
pads (3):
  rect 1.6x3.5 smd: 1(0,0) 3(5.08,0)
  rect 12x9.75 smd: 2(2.8,9.6)
Top Overlay:
  lines w0.2: -3.6,3.9 -1.2,3.9 -1.2,-2.1 6.3,-2.1 6.3,3.9 9.3,3.9 9.3,14.9 -3.6,14.9 -3.6,3.9
3D body "User Library-D2PAK.step": height 4.83, standoff 0, extent -2.535,-1.28 8.135,14.6

## DFN3x3-10 [mm] "3x3mm"
pads (11):
  rrect50% 0.85x0.3 smd: 1(-1.5,1) 2(-1.5,0.5) 3(-1.5,0) 4(-1.5,-0.5) 5(-1.5,-1) 6(1.5,-1) 7(1.5,-0.5) 8(1.5,0) 9(1.5,0.5) 10(1.5,1)
  rrect10% 1.75x2.5 smd: 11(0,0)
Top Overlay:
  circle w0.25: c-2.01,1.675 r0.125
  lines w0.2: -1.609,1.378 -1.609,1.601 -1.059,1.601 ; -1.6,-1.382 -1.6,-1.606 -1.05,-1.606 ; 1.048,-1.6 1.598,-1.6 1.598,-1.377 ; 1.063,1.609 1.613,1.609 1.613,1.385
Mechanical 13:
  lines w0.1: -1.5,0.75 -0.75,1.5 ; -1.5,-1.5 -1.5,1.5 1.5,1.5 1.5,-1.5 -1.5,-1.5
Mechanical 15:
  lines w0.05: -2.15,-1.825 -2.15,1.825 2.15,1.825 2.15,-1.825 -2.15,-1.825
3D body "STBB1-APUR.stp": height 1, standoff 0, extent -1.55,-1.5 1.55,1.5

## DFN4x4-10 [mm] "4x4mm"
pads (11):
  rrect50% 0.85x0.3 smd: 1(-2.05,1.6) 2(-2.05,0.8) 3(-2.05,0) 4(-2.05,-0.8) 5(-2.05,-1.6) 6(2.05,-1.6) 7(2.05,-0.8) 8(2.05,0) 9(2.05,0.8) 10(2.05,1.6)
  rrect10% 2.6x3 smd: 11(0,0)
Top Overlay:
  circle w0.25: c-2.56,2.275 r0.125
  lines w0.2: -2.075,-1.976 -2.075,-2.2 2.05,-2.2 2.05,-1.976 ; -2.075,1.975 -2.075,2.199 2.05,2.199 2.05,1.975
Mechanical 13:
  lines w0.1: -2.05,0.85 -1.3,1.6 ; -2.05,-1.6 2.05,-1.6 2.05,1.575 2.025,1.6 -2.05,1.6 -2.05,-1.6
Mechanical 15:
  lines w0.05: -2.7,-2.425 -2.7,2.425 2.7,2.425 2.7,-2.425 -2.7,-2.425

## DFN-6 [mm] "SON, 6-Leads, Body 3.00x3.00mm, Pitch 1.00mm, Thermal Pad 2.40x1.50mm, IPC Medium Density"
height 1
pads (7):
  rect 0.75x0.4 smd: 1(-1.475,1) 2(-1.475,0) 3(-1.475,-1) 4(1.475,-1) 5(1.475,0) 6(1.475,1)
  rect 1x1 smd: 7(0,0)
Top Layer:
  region: -0.739,-1.193 0.761,-1.193 0.761,1.207 -0.539,1.207 -0.739,1.007
Top Overlay:
  circle w0.1: c-2.05,1.65 r0.05
  lines w0.2: -1.65,-1.6 -1.65,-1.65 -1.2,-1.65 ; -1.65,1.6 -1.65,1.65 -1.2,1.65 ; 1.2,-1.65 1.65,-1.65 1.65,-1.6 ; 1.2,1.65 1.65,1.65 1.65,1.6
Mechanical 13:
  circle w0.1: c-0.6,0.6 r0.5
  lines w0.1: -1.5,-1.5 -1.5,1.5 1.5,1.5 1.5,-1.5 -1.5,-1.5
Mechanical 15:
  lines w0.05: -2.085,-1.75 -2.085,1.75 2.085,1.75 2.085,-1.75 -2.085,-1.75
  lines w0.1: -0.5,0 0.5,0 ; 0,-0.5 0,0.5
3D body "SON100P300X100_HS-7N.step": height 1, standoff 0, extent -1.5,-1.5 1.5,1.5

## DFN-10 (LGA) [mm] "SON, 10-Leads, Body 4.00x2.70mm, Pitch 0.60mm, Thermal Pad 2.40x1.18mm, IPC Medium Density"
height 1.1
pads (11):
  rect 0.9x0.3 smd: 1(-1.24,1.2) 2(-1.24,0.6) 3(-1.24,0) 4(-1.24,-0.6) 5(-1.24,-1.2) 6(1.24,-1.2) 7(1.24,-0.6) 8(1.24,0) 9(1.24,0.6) 10(1.24,1.2)
  rect 1x1 smd: 11(0,0)
Top Layer:
  region: -0.6,-1.2 0.6,-1.2 0.6,1.2 -0.35,1.2 -0.6,0.975
Top Overlay:
  circle w0.1: c-1.9,2.15 r0.05
  lines w0.2: -1.5,-1.75 -1.5,-2.15 -0.89,-2.15 ; -1.5,1.75 -1.5,2.15 -0.89,2.15 ; 0.89,-2.15 1.5,-2.15 1.5,-1.75 ; 0.89,2.15 1.5,2.15 1.5,1.75
Mechanical 13:
  circle w0.1: c-0.45,1.1 r0.5
  lines w0.1: -1.35,-2 1.35,-2 1.35,2 -1.35,2 -1.35,-2
Mechanical 15:
  lines w0.05: -1.935,-2.25 1.935,-2.25 1.935,2.25 -1.935,2.25 -1.935,-2.25
  lines w0.1: -0.5,0 0.5,0 ; 0,-0.5 0,0.5
3D body: height 1.1, standoff 0, extent -1.35,-2 1.35,2

## DFN-12 [mm] "SON, 12-Leads, Body 4.00x3.00mm, Pitch 0.50mm, Thermal Pad 3.30x1.70mm, IPC Medium Density"
height 0.75
pads (13):
  rect 0.75x0.25 smd: 1(-1.44,1.25) 2(-1.44,0.75) 3(-1.44,0.25) 4(-1.44,-0.25) 5(-1.44,-0.75) 6(-1.44,-1.25) 7(1.44,-1.25) 8(1.44,-0.75) 9(1.44,-0.25) 10(1.44,0.25) 11(1.44,0.75) 12(1.44,1.25)
  rect 1x1 smd: 13(0,0)
Top Layer:
  region: -0.855,-1.662 -0.855,1.338 -0.555,1.638 0.845,1.638 0.845,-1.662
Top Overlay:
  circle w0.1: c-2.05,2.15 r0.05
  lines w0.2: -1.65,-1.775 -1.65,-2.15 -1.165,-2.15 ; -1.65,1.775 -1.65,2.15 -1.165,2.15 ; 1.165,-2.15 1.65,-2.15 1.65,-1.775 ; 1.165,2.15 1.65,2.15 1.65,1.775
Mechanical 13:
  circle w0.1: c-0.6,1.1 r0.5
  lines w0.1: -1.5,-2 1.5,-2 1.5,2 -1.5,2 -1.5,-2
Mechanical 15:
  lines w0.05: -2.085,-2.25 2.085,-2.25 2.085,2.25 -2.085,2.25 -2.085,-2.25
  lines w0.1: -0.5,0 0.5,0 ; 0,-0.5 0,0.5
3D body "SON50P300X75_HS-13N.step": height 0.75, standoff 0, extent -1.5,-2 1.5,2